# Altium footprint library STM32F103_Warship.PcbLib: 55 footprints (part 2 of 4)
Each footprint in its own frame and in the unit in brackets; x right, y up, seen from the top. Pads: shape width x height; smd on the part's side, far side on the other; paste and mask are expansions set on the pad; w line width, h text height; cw(c..) or ccw(c..) is an arc to the next point about the centre after c.
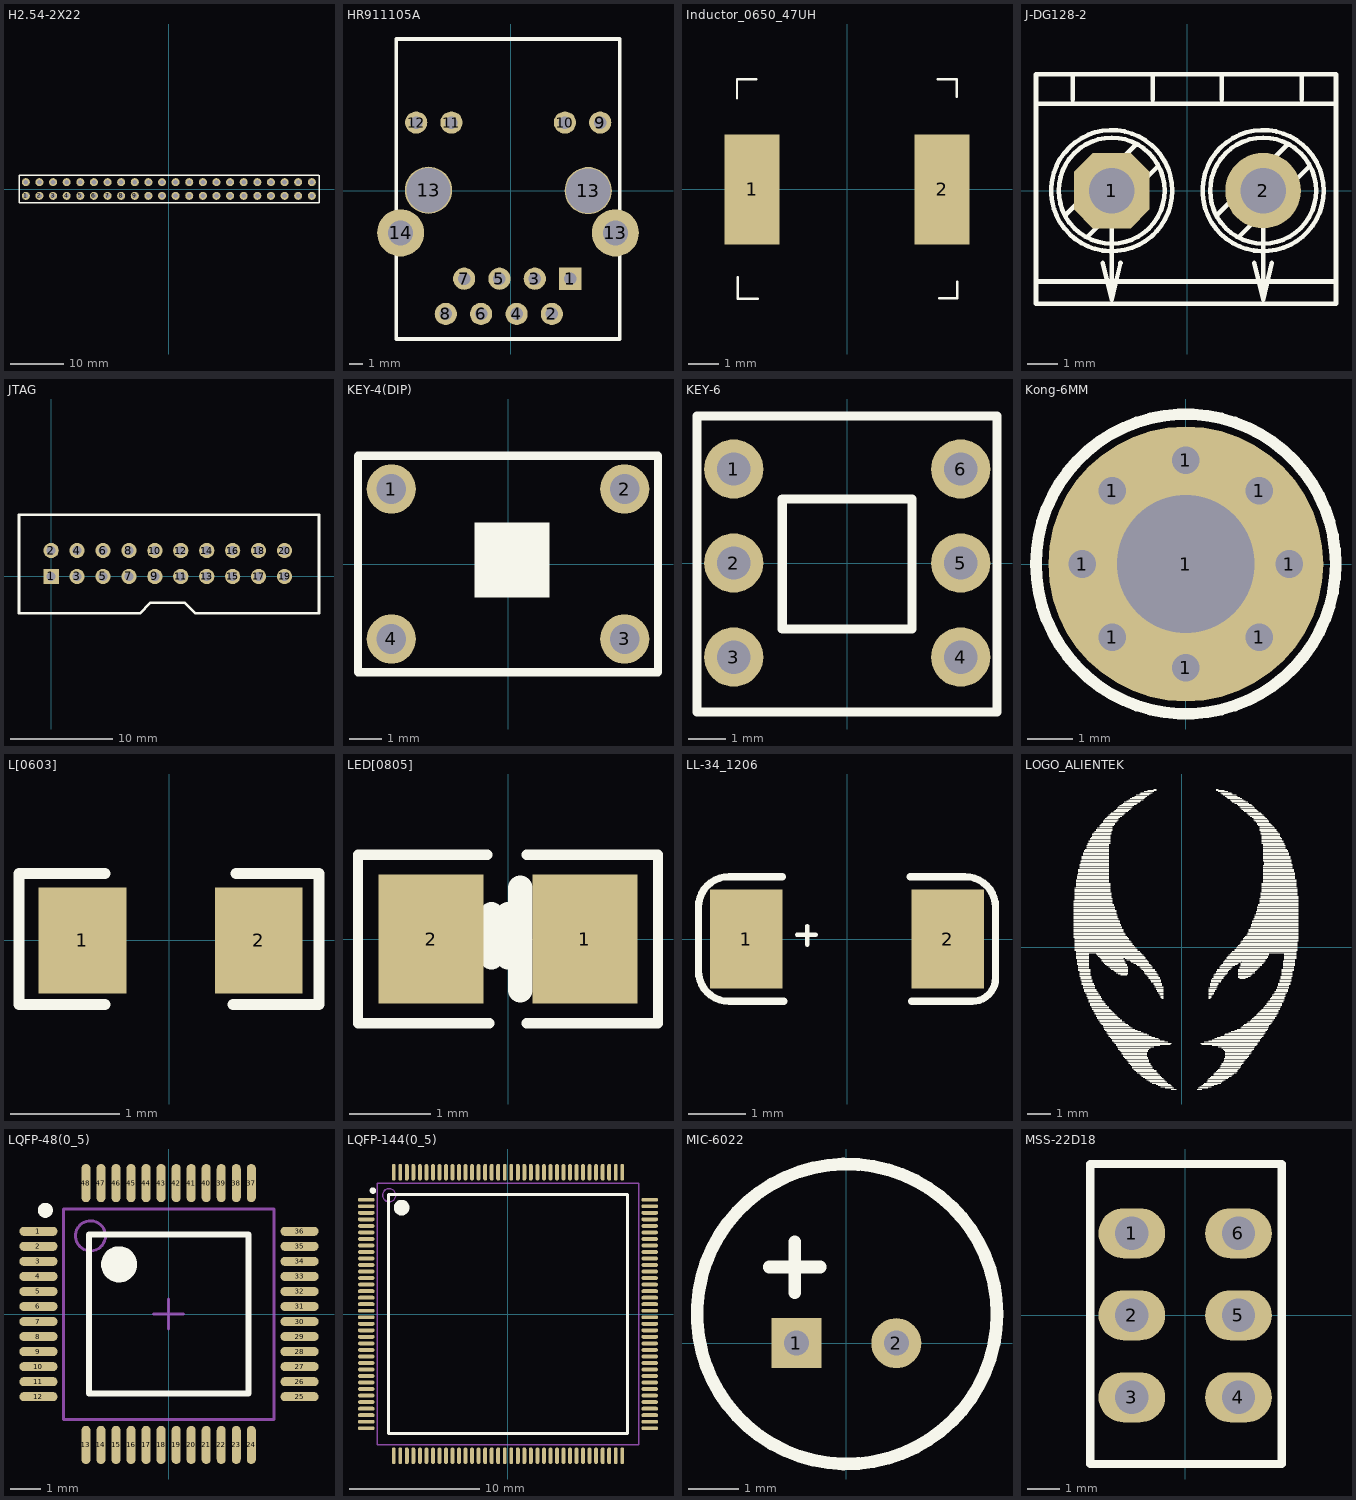
[diagram p1: the footprints below, top view; thin cyan lines are the x and y axes]

## H2.54-2X22 [mm]
pads (44):
  round 1.5 hole 0.9: 1(-26.67,-1.27) 2(-24.13,-1.27) 3(-21.59,-1.27) 4(-19.05,-1.27) 5(-16.51,-1.27) 6(-13.97,-1.27) 7(-11.43,-1.27) 8(-8.89,-1.27) 9(-6.35,-1.27) 10(-3.81,-1.27) 11(-1.27,-1.27) 12(1.27,-1.27) 13(3.81,-1.27) 14(6.35,-1.27) 15(8.89,-1.27) 16(11.43,-1.27) 17(13.97,-1.27) 18(16.51,-1.27) 19(19.05,-1.27) 20(21.59,-1.27) 21(24.13,-1.27) 22(26.67,-1.27) 23(26.67,1.27) 24(24.13,1.27) 25(21.59,1.27) 26(19.05,1.27) 27(16.51,1.27) 28(13.97,1.27) 29(11.43,1.27) 30(8.89,1.27) 31(6.35,1.27) 32(3.81,1.27) 33(1.27,1.27) 34(-1.27,1.27) 35(-3.81,1.27) 36(-6.35,1.27) 37(-8.89,1.27) 38(-11.43,1.27) 39(-13.97,1.27) 40(-16.51,1.27) 41(-19.05,1.27) 42(-21.59,1.27) 43(-24.13,1.27) 44(-26.67,1.27)
Top Overlay:
  lines w0.254: -22.86,2.54 27.94,2.54 ; -20.32,2.54 -27.94,2.54 -27.94,-2.54 22.86,-2.54 ; 20.32,-2.54 28.01,-2.54 28.01,2.54
3D body "User Library-Header_Male_10Pin.STEP": height 8.54, standoff -3, extent -27.94,0.025 -2.54,2.515
3D body "User Library-Header_Male_10Pin.STEP": height 8.54, standoff -3, extent -22.86,0.025 2.54,2.515
3D body "User Library-Header_Male_10Pin.STEP": height 8.54, standoff -3, extent 2.54,0.025 27.94,2.515
3D body "User Library-Header_Male_10Pin.STEP": height 8.54, standoff -3, extent -27.94,-2.515 -2.54,-0.025
3D body "User Library-Header_Male_10Pin.STEP": height 8.54, standoff -3, extent -2.54,-2.515 22.86,-0.025
3D body "User Library-Header_Male_10Pin.STEP": height 8.54, standoff -3, extent 2.54,-2.515 27.94,-0.025

## HR911105A [mm]
pads (16):
  rect 1.6x1.6 hole 0.9: 1(4.293,-6.325)
  round 1.6 hole 0.9: 2(2.972,-8.865) 3(1.744,-6.325) 4(0.432,-8.865) 5(-0.804,-6.325) 6(-2.134,-8.865) 7(-3.353,-6.325) 8(-4.674,-8.865) 9(6.452,4.928) 10(3.912,4.928) 11(-4.267,4.928) 12(-6.807,4.928)
  round 3.4 hole 3.2: 13(-5.918,0.051) 13(5.588,0.025)
  round 3.4 hole 1.8: 13(7.544,-3.023) 14(-7.925,-3.023)
Top Overlay:
  lines w0.254: -8.255,-10.668 7.874,-10.668 7.874,10.947 -8.255,10.947 -8.255,-10.668
3D body "User Library-HR911105A.STEP": height 15, standoff -1.5, extent -8.133,-10.497 7.747,10.903

## Inductor_0650_47UH [mil]
pads (2):
  rect 70.87x143 smd: 1(-123.5,0) 2(123.5,0)
Top Overlay:
  lines w3: -143.02,118 -143.02,142.48 ; -142.5,143 -118,143 ; -142.02,-142.34 -142.02,-114 ; -141.5,-142.34 -116,-142.34 ; 118,143 142.5,143 142.5,120 ; 119.88,-141.74 135.62,-141.74 143.5,-141.74 143.5,-120.4
3D body "User Library-WE-PD Series 7_3x7_3x4_5mm.STEP": height 165.35, standoff -15.75, extent -143.4,-143.4 144,144

## J-DG128-2 [mm]
pads (2):
  oct 2.5x2.5 hole 1.5: 1(-2.5,0)
  round 2.5 hole 1.5: 2(2.5,0)
Top Overlay:
  circle w0.15: c2.5,0 r2
  circle w0.15: c2.5,0 r1.75
  circle w0.15: c-2.5,0 r2
  circle w0.15: c-2.5,0 r1.75
  lines w0.15: -5,-3 4.906,-3 ; -5,2.874 4.906,2.874 ; -4.013,-0.791 -1.702,1.52 ; -3.781,3 -3.781,3.839 ; -3.298,-1.52 -0.987,0.791 ; -2.79,-2.389 -2.5,-3.594 ; -2.5,0 -2.5,-3.594 ; -2.21,-2.389 -2.5,-3.594 ; -1.139,3 -1.139,3.839 ; 0.987,-0.791 3.298,1.52 ; 1.139,3 1.139,3.839 ; 1.702,-1.52 4.013,0.791 ; 2.21,-2.389 2.5,-3.594 ; 2.5,0 2.5,-3.594 ; 2.79,-2.389 2.5,-3.594 ; 3.781,3 3.781,3.839 ; -5,-3.73 4.906,-3.73 4.906,3.839 -5,3.839 -5,-3.73
3D body "User Library-CN_BT_1X2.step": height 10, standoff -2.28, extent -5.491,-3.85 5.009,3.85

## JTAG [mm]
pads (20):
  rect 1.5x1.5 hole 0.9: 1(0,0)
  round 1.5 hole 0.9: 2(0,2.54) 3(2.54,0) 4(2.54,2.54) 5(5.08,0) 6(5.08,2.54) 7(7.62,0) 8(7.62,2.54) 9(10.16,0) 10(10.16,2.54) 11(12.7,0) 12(12.7,2.54) 13(15.24,0) 14(15.24,2.54) 15(17.78,0) 16(17.78,2.54) 17(20.32,0) 18(20.32,2.54) 19(22.86,0) 20(22.86,2.54)
Top Overlay:
  lines w0.254: -3.15,-3.607 -3.15,3.531 -3.15,6.045 26.238,6.045 26.238,-1.27 26.238,-3.607 14.122,-3.607 13.106,-2.591 9.703,-2.591 8.687,-3.607 -3.15,-3.607
3D body "User Library-Samtec-TSS-110-01-G-D.STEP": height 8.89, standoff -3.3, extent -3.048,-3.531 26.162,5.944

## KEY-4(DIP) [mm]
pads (4):
  round 1.5 hole 0.9: 1(-3.556,2.286) 2(3.556,2.286) 3(3.556,-2.286) 4(-3.556,-2.286)
Top Overlay:
  rectangle: -1.016,-1.016 1.27,1.27
  lines w0.254: -4.572,-3.302 4.572,-3.302 4.572,3.302 -4.572,3.302 -4.572,-3.302
3D body "Touche DTS-6X.STEP": height 4.5, standoff -3.06, extent -3.96,-3.1 3.96,3.1

## KEY-6 [mm]
pads (6):
  round 1.6 hole 0.9: 1(-3.065,2.54) 2(-3.065,0) 3(-3.065,-2.54) 4(3.065,-2.54) 5(3.065,0) 6(3.065,2.54)
Top Overlay:
  lines w0.25: -4.056,-4.025 -4.056,3.975 4.047,3.975 4.047,-4.025 -4.056,-4.025 ; -1.753,-1.778 1.753,-1.778 1.753,1.727 -1.753,1.727 -1.753,-1.778
3D body "User Library-PSM1-0-0.step": height 13.5, standoff -3.5, extent -4,-4.025 4,3.975

## Kong-6MM [mm]
pads (9):
  round 0.6 hole 0.6: 1(-2.261,0) 1(-1.6,-1.6) 1(-1.6,1.6) 1(0,-2.261) 1(0,2.261) 1(1.6,-1.6) 1(1.6,1.6) 1(2.261,0)
  round 6 hole 3: 1(0,0)
Top Overlay:
  circle w0.254: c0,0 r3.269
Bottom Overlay:
  circle w0.254: c0.008,0 r3.269

## L[0603] [mm]
pads (2):
  rect 0.8x0.965 smd: 1(-0.792,0) 2(0.818,0)
Top Overlay:
  lines w0.102: -0.589,-0.584 -1.372,-0.584 -1.372,0.61 -0.589,0.61 ; 0.584,-0.584 1.367,-0.584 1.367,0.61 0.61,0.61
3D body "SW3dPS-0603 SMD Resistor.STEP": height 0.3, standoff 0, extent -0.781,-0.406 0.819,0.394

## LED[0805] [mm]
pads (2):
  rect 1.3x1.6 smd: 1(0.95,0) 2(-0.95,0)
Top Overlay:
  lines w0.127: -0.258,1.041 -1.854,1.041 -1.854,-1.041 -0.229,-1.041 ; 0.229,-1.041 1.854,-1.041 1.854,1.041 0.229,1.041
  lines w0.3: -0.203,-0.229 -0.203,0.305 ; 0,-0.229 0,0.305 ; 0.152,-0.635 0.152,0.635
3D body "led0805_SMT_green.step": height 1.1, standoff -0.01, extent -1.016,-0.635 1.016,0.635

## LL-34_1206 [mil]
pads (2):
  rect 50x68 smd: 1(-69.5,0) 2(69.5,0)
Top Overlay:
  lines w3: -34.5,3 -21.5,3 ; -27.5,-4 -27.5,9
  lines w5: -44.5,43 -81.5,43 ccw(c-81.5,22) -102.5,22 -102.5,-22 ccw(c-81.5,-22) -81.5,-43 -43.5,-43 ; 43.5,43 81.5,43 cw(c81.5,22) 102.5,22 102.5,-27 cw(c86.5,-27) 86.5,-43 44.5,-43
3D body "User Library-Diode MELF.STEP": height 57.87, standoff -1.18, extent -69.39,-28.52 68.4,30.53

## LOGO_ALIENTEK [mm]
Top Overlay:
  drawing of 620 lines, arcs and shapes, not listed

## LQFP-48(0_5) [mm]
pads (48):
  oval 1.27x0.3 smd: 1(-4.329,2.75) 2(-4.329,2.25) 3(-4.329,1.75) 4(-4.329,1.25) 5(-4.329,0.75) 6(-4.329,0.25) 7(-4.329,-0.25) 8(-4.329,-0.75) 9(-4.329,-1.25) 10(-4.329,-1.75) 11(-4.329,-2.25) 12(-4.329,-2.75) 25(4.354,-2.75) 26(4.354,-2.25) 27(4.354,-1.75) 28(4.354,-1.25) 29(4.354,-0.75) 30(4.354,-0.25) 31(4.354,0.25) 32(4.354,0.75) 33(4.354,1.25) 34(4.354,1.75) 35(4.354,2.25) 36(4.354,2.75)
  oval 0.3x1.27 smd: 13(-2.75,-4.354) 14(-2.25,-4.354) 15(-1.75,-4.354) 16(-1.25,-4.354) 17(-0.75,-4.354) 18(-0.25,-4.354) 19(0.25,-4.354) 20(0.75,-4.354) 21(1.25,-4.354) 22(1.75,-4.354) 23(2.25,-4.354) 24(2.75,-4.354) 37(2.75,4.354) 38(2.25,4.354) 39(1.75,4.354) 40(1.25,4.354) 41(0.75,4.354) 42(0.25,4.354) 43(-0.25,4.354) 44(-0.75,4.354) 45(-1.25,4.354) 46(-1.75,4.354) 47(-2.25,4.354) 48(-2.75,4.354)
Top Overlay:
  circle w0.25: c-4.1,3.45 r0.125
  circle w0.6: c-1.65,1.65 r0.3
  lines w0.2: -2.65,-2.65 -2.65,2.65 2.65,2.65 2.65,-2.65 -2.65,-2.65
Mechanical 13:
  circle w0.1: c-2.6,2.6 r0.5
  lines w0.1: -3.5,-3.505 -3.5,3.5 3.5,3.5 3.5,-3.505 -3.5,-3.505
Mechanical 15:
  lines w0.1: -0.5,0 0.5,0 ; 0,-0.5 0,0.5
3D body "User Library-LQFP48-2.STEP": height 1.62, standoff -0.01, extent -4.572,-4.572 4.572,4.572

## LQFP-144(0_5) [mm]
pads (144):
  oval 1.27x0.3 smd: 1(-10.854,8.75) 2(-10.854,8.25) 3(-10.854,7.75) 4(-10.854,7.25) 5(-10.854,6.75) 6(-10.854,6.25) 7(-10.854,5.75) 8(-10.854,5.25) 9(-10.854,4.75) 10(-10.854,4.25) 11(-10.854,3.75) 12(-10.854,3.25) 13(-10.854,2.75) 14(-10.854,2.25) 15(-10.854,1.75) 16(-10.854,1.25) 17(-10.854,0.75) 18(-10.854,0.25) 19(-10.854,-0.25) 20(-10.854,-0.75) 21(-10.854,-1.25) 22(-10.854,-1.75) 23(-10.854,-2.25) 24(-10.854,-2.75) 25(-10.854,-3.25) 26(-10.854,-3.75) 27(-10.854,-4.25) 28(-10.854,-4.75) 29(-10.854,-5.25) 30(-10.854,-5.75) 31(-10.854,-6.25) 32(-10.854,-6.75) 33(-10.854,-7.25) 34(-10.854,-7.75) 35(-10.854,-8.25) 36(-10.854,-8.75) 73(10.854,-8.75) 74(10.854,-8.25) 75(10.854,-7.75) 76(10.854,-7.25) 77(10.854,-6.75) 78(10.854,-6.25) 79(10.854,-5.75) 80(10.854,-5.25) 81(10.854,-4.75) 82(10.854,-4.25) 83(10.854,-3.75) 84(10.854,-3.25) 85(10.854,-2.75) 86(10.854,-2.25) 87(10.854,-1.75) 88(10.854,-1.25) 89(10.854,-0.75) 90(10.854,-0.25) 91(10.854,0.25) 92(10.854,0.75) 93(10.854,1.25) 94(10.854,1.75) 95(10.854,2.25) 96(10.854,2.75) 97(10.854,3.25) 98(10.854,3.75) 99(10.854,4.25) 100(10.854,4.75) 101(10.854,5.25) 102(10.854,5.75) 103(10.854,6.25) 104(10.854,6.75) 105(10.854,7.25) 106(10.854,7.75) 107(10.854,8.25) 108(10.854,8.75)
  oval 0.3x1.27 smd: 37(-8.75,-10.854) 38(-8.25,-10.854) 39(-7.75,-10.854) 40(-7.25,-10.854) 41(-6.75,-10.854) 42(-6.25,-10.854) 43(-5.75,-10.854) 44(-5.25,-10.854) 45(-4.75,-10.854) 46(-4.25,-10.854) 47(-3.75,-10.854) 48(-3.25,-10.854) 49(-2.75,-10.854) 50(-2.25,-10.854) 51(-1.75,-10.854) 52(-1.25,-10.854) 53(-0.75,-10.854) 54(-0.25,-10.854) 55(0.25,-10.854) 56(0.75,-10.854) 57(1.25,-10.854) 58(1.75,-10.854) 59(2.25,-10.854) 60(2.75,-10.854) 61(3.25,-10.854) 62(3.75,-10.854) 63(4.25,-10.854) 64(4.75,-10.854) 65(5.25,-10.854) 66(5.75,-10.854) 67(6.25,-10.854) 68(6.75,-10.854) 69(7.25,-10.854) 70(7.75,-10.854) 71(8.25,-10.854) 72(8.75,-10.854) 109(8.75,10.854) 110(8.25,10.854) 111(7.75,10.854) 112(7.25,10.854) 113(6.75,10.854) 114(6.25,10.854) 115(5.75,10.854) 116(5.25,10.854) 117(4.75,10.854) 118(4.25,10.854) 119(3.75,10.854) 120(3.25,10.854) 121(2.75,10.854) 122(2.25,10.854) 123(1.75,10.854) 124(1.25,10.854) 125(0.75,10.854) 126(0.25,10.854) 127(-0.25,10.854) 128(-0.75,10.854) 129(-1.25,10.854) 130(-1.75,10.854) 131(-2.25,10.854) 132(-2.75,10.854) 133(-3.25,10.854) 134(-3.75,10.854) 135(-4.25,10.854) 136(-4.75,10.854) 137(-5.25,10.854) 138(-5.75,10.854) 139(-6.25,10.854) 140(-6.75,10.854) 141(-7.25,10.854) 142(-7.75,10.854) 143(-8.25,10.854) 144(-8.75,10.854)
Top Overlay:
  circle w0.25: c-10.346,9.45 r0.125
  circle w0.6: c-8.15,8.15 r0.3
  lines w0.2: -9.15,-9.15 -9.15,9.15 9.15,9.15 9.15,-9.15 -9.15,-9.15
Mechanical 13:
  circle w0.1: c-9.1,9.1 r0.5
  lines w0.1: -10,-10 -10,10 10,10 10,-10 -10,-10
3D body "SW3dPS-LQFP-144.STEP": height 1.74, standoff 0.04, extent -19.997,-20.028 20.003,19.972

## MIC-6022 [mm]
pads (2):
  rect 1x1 hole 0.5: 1(-1,0)
  round 1 hole 0.5: 2(1,0)
Top Overlay:
  circle w0.254: c0.013,0.584 r3
  lines w0.254: -1.54,1.524 -0.524,1.524 ; -1.032,1.016 -1.032,2.032
3D body: height 2.81, standoff 2.8, extent -2.579,-2.011 2.6,3.179
3D body: height 2.8, standoff 0, extent -2.976,-2.41 3,3.578
3D body: height 0, standoff -2, extent -1.099,-0.1 -0.9,0.1
3D body: height 0, standoff -1, extent 0.917,-0.049 1.116,0.151

## MSS-22D18 [mil]
pads (6):
  oval 80x60 hole 40: 1(-63.98,98.43) 2(-63.98,0) 3(-63.98,-98.43) 4(63.98,-98.43) 5(63.98,0) 6(63.98,98.43)
Top Overlay:
  lines w10: -113.98,-178.43 -113.98,181.57 116.02,181.57 116.02,-178.43 -113.98,-178.43
3D body: height 11.81, standoff -78.74, extent 50.29,-106.78 73.81,-83.21
3D body: height 11.81, standoff -78.74, extent -77.67,-106.78 -54.14,-83.21
3D body: height 11.81, standoff -78.74, extent -77.67,-8.36 -54.14,15.22
3D body: height 11.81, standoff -78.74, extent 50.29,-8.36 73.81,15.22
3D body: height 11.81, standoff -78.74, extent 50.29,90.07 73.81,113.64
3D body: height 11.81, standoff -78.74, extent -75.69,86.64 -52.16,110.22
3D body: height 244.09, standoff 137.8, extent -40,-120 47,-4
3D body: height 141.73, standoff 137.8, extent -61,-142 67,142
3D body: height 137.8, standoff 0, extent -114,-178 117,183